# Altium footprint library PBL - THD Packages.PcbLib: 256 footprints (part 16 of 16)
Each footprint in its own frame and in the unit in brackets; x right, y up, seen from the top. Pads: shape width x height; smd on the part's side, far side on the other; paste and mask are expansions set on the pad; w line width, h text height; cw(c..) or ccw(c..) is an arc to the next point about the centre after c.
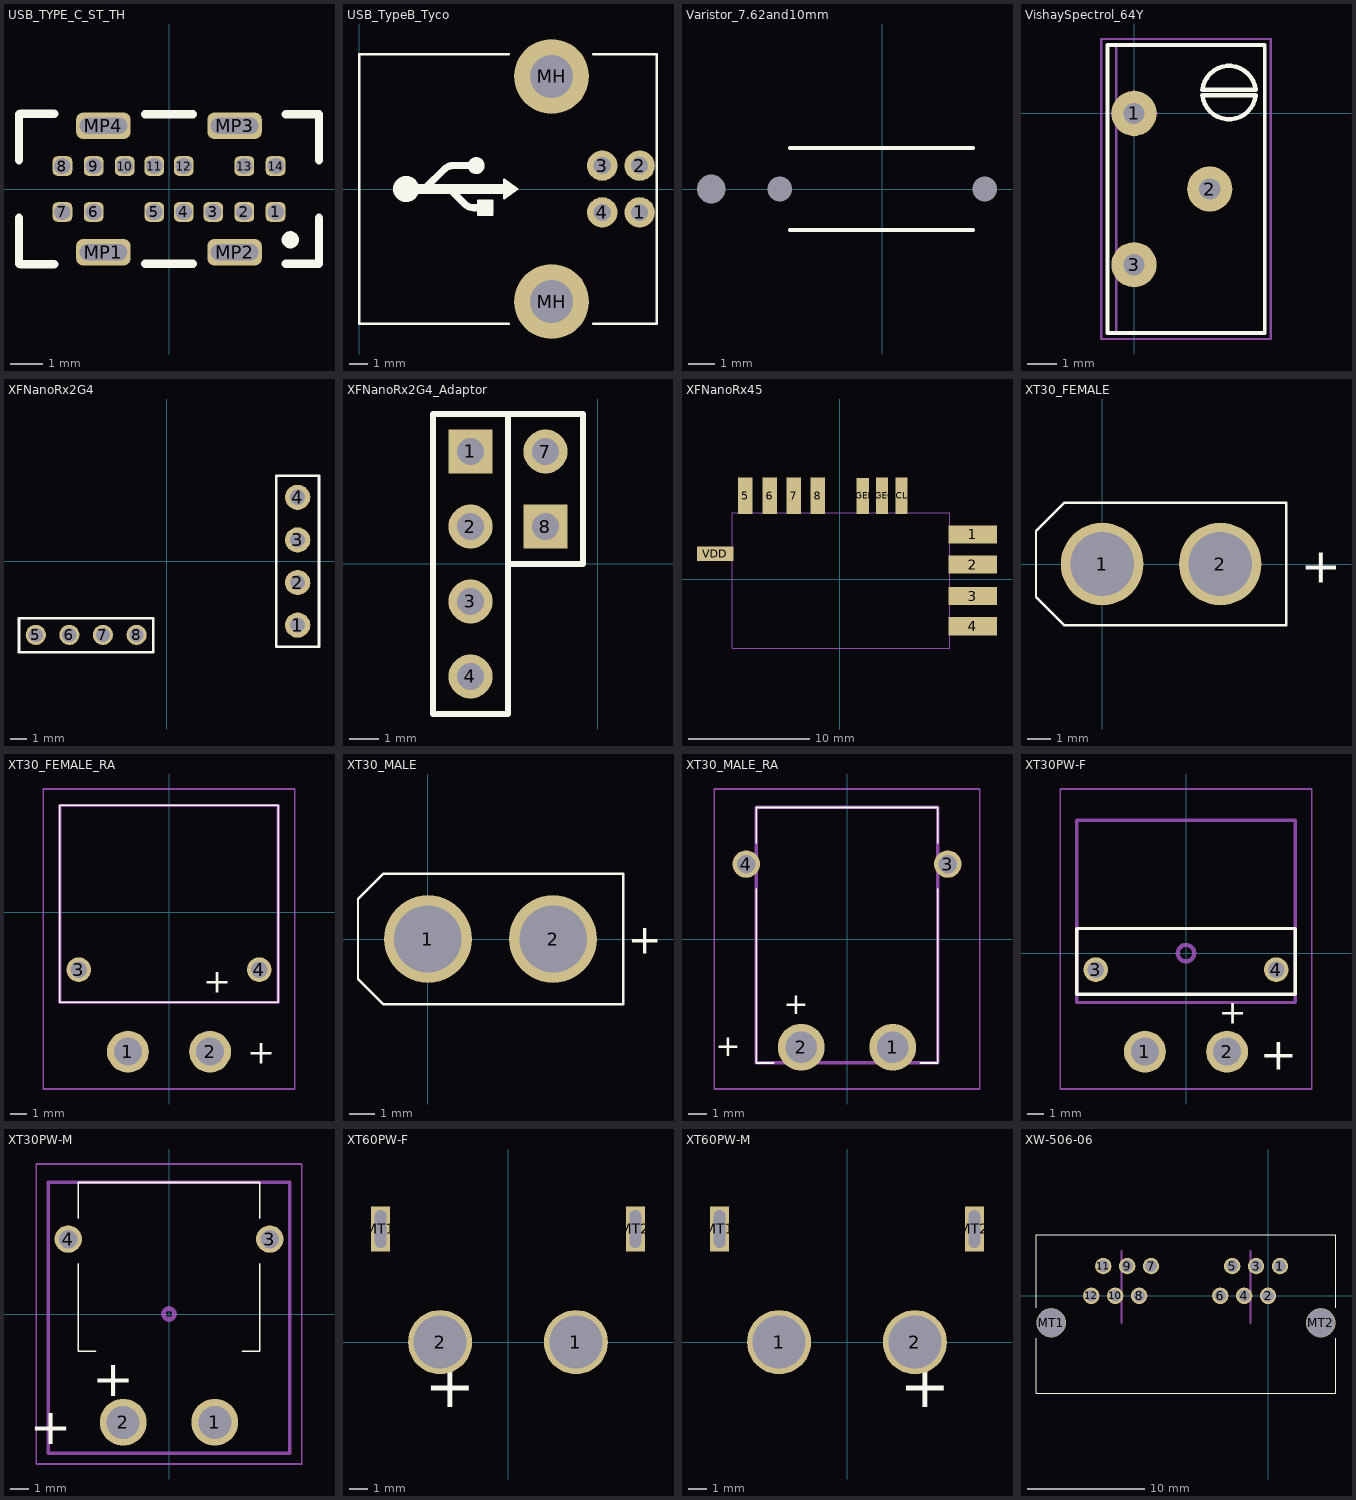
[diagram p15: the footprints below, top view; thin cyan lines are the x and y axes]

## USB_TYPE_C_ST_TH [mm]
pads (18):
  rrect50% 0.6x0.6 hole 0.5: 1(3.25,-0.7) 2(2.3,-0.7) 3(1.35,-0.7) 4(0.45,-0.7) 5(-0.45,-0.7) 6(-2.3,-0.7) 7(-3.25,-0.7) 8(-3.25,0.7) 9(-2.3,0.7) 10(-1.35,0.7) 11(-0.45,0.7) 12(0.45,0.7) 13(2.3,0.7) 14(3.25,0.7)
  rrect50% 1.658x0.8 hole 0.5 slot 1.45 at 0 deg: MP1(-2,-1.93) MP2(2,-1.93) MP3(2,1.93) MP4(-2,1.93)
Top Overlay:
  circle w0.254: c3.7,-1.55 r0.135
  lines w0.254: -4.575,-2.275 -4.575,-0.875 ; -4.575,0.875 -4.575,2.275 ; -4.516,-2.3 -3.5,-2.3 ; -4.516,2.3 -3.5,2.3 ; -0.731,-2.275 0.731,-2.275 ; -0.731,2.275 0.731,2.275 ; 3.559,-2.275 4.575,-2.275 4.575,-0.875 ; 3.559,2.275 4.575,2.275 4.575,0.875
3D body "USB3.1TYPE-C 14P.STP": height 10, standoff -1.2, extent -4.5,-2.5 4.5,2.5

## USB_TypeB_Tyco [mm]
height 11.1
pads (6):
  round 1.626 hole 0.914: 1(14.99,-1.25) 2(14.99,1.25) 3(12.99,1.25) 4(12.99,-1.25)
  round 4 hole 2.3: MH(10.28,-6.02) MH(10.28,6.02)
Top Overlay:
  circle w0.508: c6.25,1.25 r0.2
  circle w0.889: c2.5,0 r0.254
  region: 7.1,-1.375 6.35,-1.375 6.35,-0.625 7.1,-0.625
  region: 8.45,0 7.75,-0.5 7.75,0.5
  lines w0.127: 8,-7.2 0,-7.2 0,7.2 8,7.2 ; 12.5,-7.2 15.9,-7.2 15.9,7.2 12.5,7.2 ; 6.35,-1.375 7.1,-1.375 7.1,-0.625 6.35,-0.625 6.35,-1.375 ; 7.75,-0.5 7.75,0.5 8.45,0 7.75,-0.5
  lines w0.381: 3.547,0.062 4.547,1.062 cw(c5,0.61) 5,1.25 6.25,1.25 ; 4.897,-0.062 5.647,-0.812 ccw(c6.1,-0.36) 6.1,-1 6.35,-1
  lines w0.508: 3,0 7.75,0
3D body "c-0292304-01-b-3d.stp": height 11.5, standoff -3.93, extent 0,-7.194 15.7,7.194

## Varistor_7.62and10mm [mil] "Capacitor, Ceramic, Thru-Hole, Dipped Radial; Body 6.8 x 3 mm (WxT) Pin Spacing 7.62 mm (typ)"
height 236.22
pads (3):
  round 0 / inner round 0 / far side round 100 hole 42 unplated: 1(-250,0)
  round 0 / inner round 0 / far side oval 100x85 hole 36 unplated: 1(-150,0) 2(150,0)
Top Overlay:
  lines w6: -135,-60 132.72,-60 ; -135,60 132.72,60
3D body "MOV-10N331k_V.STEP": height 472.44, standoff -98.43, extent -216.47,-69.98 216.44,68.36

## VishaySpectrol_64Y [mil] "VISHAY SPECTROL - 64Y - TRIMMER"
height 437.01
pads (3):
  round 60 hole 28: 1(0,0) 2(100.39,-100.39) 3(0,-200.79)
Top Overlay:
  lines w5: -35.43,-291.34 173.23,-291.34 173.23,90.55 -35.43,90.55 -35.43,-291.34
  lines w6: 90.69,23.81 161.27,23.81 ; 90.68,31.31 161.28,31.31 ; 90.75,23.82 ccw(c125.98,27.55) 161.21,23.82 ; 90.74,31.3 cw(c125.98,27.55) 161.22,31.3
13 - 3D Top Side:
  lines w3: -23.62,-291.34 173.23,-291.34 173.23,90.55 -23.62,90.55 -23.62,-291.34
15 - Top Courtyards:
  lines w3: -30,0 30,0 ; 0,-30 0,30 ; -43.62,-299.34 -43.62,98.66 181.38,98.66 181.38,-299.34 -43.62,-299.34
3D body: height 437.01, standoff 385.83, extent 82.68,-15.75 168.95,70.7
3D body: height 385.83, standoff 0, extent -23.62,-291.34 173.23,90.55

## XFNanoRx2G4 [mm] "baudrate translater"
pads (8):
  round 1.5 hole 0.9: 1(7.8,-3.8) 2(7.8,-1.26) 3(7.8,1.28) 4(7.8,3.82)
  round 1.2 hole 0.85: 5(-7.8,-4.38) 6(-5.8,-4.38) 7(-3.8,-4.38) 8(-1.8,-4.38)
Top Overlay:
  lines w0.15: 6.53,-5.07 6.53,5.09 ; 6.53,-5.07 6.53,5.09 ; 6.53,-5.07 6.53,-5.07 ; 6.53,-5.07 6.53,-5.07 ; 6.53,-5.07 9.07,-5.07 ; 6.53,-5.07 9.07,-5.07 ; 6.53,5.09 6.53,5.09 ; 6.53,5.09 6.53,5.09 ; 6.53,5.09 9.07,5.09 ; 6.53,5.09 9.07,5.09 ; 9.07,-5.07 9.07,5.09 ; 9.07,-5.07 9.07,5.09 ; 9.07,-5.07 9.07,-5.07 ; 9.07,-5.07 9.07,-5.07 ; 9.07,5.09 9.07,5.09 ; 9.07,5.09 9.07,5.09 ; -8.8,-5.4 -0.8,-5.4 -0.8,-3.4 -8.8,-3.4 -8.8,-5.4
Bottom Overlay:
  lines w0.15: 6.53,-5.07 6.53,-5.07 ; 6.53,-5.07 9.07,-5.07 ; 6.53,-5.07 9.07,-5.07 ; 6.53,-5.07 6.53,5.09 ; 6.53,-5.07 6.53,5.09 ; 6.53,-5.07 6.53,-5.07 ; 6.53,5.09 6.53,5.09 ; 6.53,5.09 9.07,5.09 ; 6.53,5.09 9.07,5.09 ; 6.53,5.09 6.53,5.09 ; 9.07,-5.07 9.07,5.09 ; 9.07,-5.07 9.07,5.09 ; 9.07,-5.07 9.07,-5.07 ; 9.07,-5.07 9.07,-5.07 ; 9.07,5.09 9.07,5.09 ; 9.07,5.09 9.07,5.09 ; -8.8,-5.4 -0.8,-5.4 -0.8,-3.4 -8.8,-3.4 -8.8,-5.4
3D body "XFNanoRx2G4v1.1.step": height 4.45, standoff 0.93, extent -9.115,-5.5 9.1,5.5

## XFNanoRx2G4_Adaptor [mm] "baudrate translater"
pads (6):
  rect 1.5x1.5 hole 0.9: 1(-4.318,3.8) 8(-1.778,1.26)
  round 1.5 hole 0.9: 2(-4.318,1.26) 3(-4.318,-1.28) 4(-4.318,-3.82) 7(-1.778,3.8)
Top Overlay:
  lines w0.2: -3.048,5.07 -5.588,5.07 -5.588,-5.09 -3.048,-5.09 -3.048,5.07 ; -3.048,5.07 -3.048,-0.01 -0.508,-0.01 -0.508,5.07 -3.048,5.07
3D body "Baudrate_Adaptor.step": height 9.45, standoff 3.41, extent -9.398,-5.588 9.017,5.588

## XFNanoRx45 [mm] "baudrate translater"
pads (12):
  rect 4x1.5 smd: 1(11,3.7) 2(11,1.2) 3(11,-1.4) 4(11,-3.9)
  rect 1.2x3 smd: 5(-7.8,6.9) 6(-5.8,6.9) 7(-3.8,6.9) 8(-1.8,6.9)
  rect 1x3 smd paste-0.6: MCLR(5.1,6.9) PGEC(3.5,6.9) PGED(1.9,6.88)
  rect 3x1.2 smd paste-0.6: VDD(-10.3,2.1)
01 - Outline:
  lines w0.1: -8.9,-5.7 -8.9,5.5 9.1,5.5 9.1,-5.7 -8.9,-5.7
3D body "XFNanoRx45.step": height 1, standoff -2.5, extent -8.905,-5.663 9.095,5.477

## XT30_FEMALE [mm]
pads (2):
  round 3.5 hole 2.7: 1(0,0) 2(5,0)
Top Overlay:
  lines w0.1: -2.8,-1.4 -1.6,-2.6 7.8,-2.6 7.8,0.2 7.8,2.6 -1.6,2.6 -2.8,1.4 -2.8,-1.4
  text "+" at 8.4,-0.8 h1.5

## XT30_FEMALE_RA [mm]
pads (4):
  round 2.55 hole 1.7: 1(-2.5,-8.5) 2(2.5,-8.5)
  round 1.5 hole 1: 3(-5.5,-3.5) 4(5.5,-3.5)
Top Overlay:
  lines w0.1: -6.65,-5.5 6.65,-5.5 6.65,6.5 -6.65,6.5 -6.65,-5.5
  text "+" at 2.1,-4.9 h1.5
  text "+" at 4.766,-9.223 h1.5
13 - 3D Top Side:
  lines w0.2: -6.65,-5.5 6.65,-5.5 6.65,6.5 -6.65,6.5 -6.65,-5.5
15 - Top Courtyards:
  lines w0.1: -7.65,-10.775 7.65,-10.775 7.65,7.5 -7.65,7.5 -7.65,-10.775
3D body "XT30PW-F.stp": height 5.1, standoff -5, extent -6.65,-9.249 6.65,6.5

## XT30_MALE [mm]
pads (2):
  round 3.5 hole 2.7: 1(0,0) 2(5,0)
Top Overlay:
  lines w0.1: -2.8,-1.6 -2.8,1.6 -1.8,2.6 7.8,2.6 7.8,-0.2 7.8,-2.6 -1.8,-2.6 -2.8,-1.6
  text "+" at 8,-0.6 h1.2

## XT30_MALE_RA [mm]
pads (4):
  round 2.55 hole 1.7: 1(2.5,-5.912) 2(-2.5,-5.912)
  round 1.5 hole 1: 3(5.5,4.088) 4(-5.5,4.088)
Top Overlay:
  lines w0.1: -4.95,2.737 -4.95,-6.762 -4,-6.762 ; -4.95,5.237 -4.95,7.187 4.95,7.187 4.95,5.237 ; 4,-6.762 4.95,-6.762 4.95,2.737
  text "+" at -2.1,-4.1 h1.2
  text "+" at -5.8,-6.4 h1.2
13 - 3D Top Side:
  lines w0.2: -4.95,-6.762 4.95,-6.762 4.95,7.187 -4.95,7.187 -4.95,-6.762
15 - Top Courtyards:
  lines w0.1: -7.25,-8.188 7.25,-8.188 7.25,8.188 -7.25,8.188 -7.25,-8.188
3D body "XT30PW-M.stp": height 5.1, standoff -5, extent -5.897,-6.762 5.9,7.187

## XT30PW-F [mm] "XT30 RA female header"
pads (4):
  round 2.55 hole 1.7: 1(-2.5,-6) 2(2.5,-6)
  round 1.5 hole 1: 3(-5.5,-1) 4(5.5,-1)
Top Overlay:
  lines w0.2: -6.65,-2.5 6.65,-2.5 6.65,1.5 -6.65,1.5 -6.65,-2.5
  text "+" at 2,-4.3 h1.5
  text "+" at 4.5,-7.1 h2
Top Component Center:
  circle w0.254: c0,0 r0.5
13 - 3D Top Side:
  lines w0.2: -6.65,-3 6.65,-3 6.65,8.1 -6.65,8.1 -6.65,-3
15 - Top Courtyards:
  lines w0.1: -7.65,-8.275 7.65,-8.275 7.65,10 -7.65,10 -7.65,-8.275
3D body "XT30PW-F.STEP": height 5, standoff -2, extent -6.65,-7.05 6.65,7.85

## XT30PW-M [mm] "XT30 RA male header"
pads (4):
  round 2.55 hole 1.8: 1(2.5,-5.912) 2(-2.5,-5.912)
  round 1.5 hole 1: 3(5.5,4.088) 4(-5.5,4.088)
Top Overlay:
  lines w0.1: -4.95,2.737 -4.95,-2.032 -4,-2.032 ; -4.95,5.237 -4.95,7.187 4.95,7.187 4.95,5.237 ; 4,-2.032 4.95,-2.032 4.95,2.737
  text "+" at -5.3,-7.1 h2
  text "+" at -1.9,-4.5 h2
Top Component Center:
  circle w0.254: c0,0 r0.3
13 - 3D Top Side:
  lines w0.2: -6.6,-7.6 -6.6,7.187 6.6,7.187 6.6,-7.6 -6.6,-7.6
15 - Top Courtyards:
  lines w0.1: -7.25,-8.188 -7.25,8.188 7.25,8.188 7.25,-8.188 -7.25,-8.188
3D body "Amass_XT30PW-M_pcb solder.stp": height 5.3, standoff -3.15, extent -6.65,-6.85 6.65,7.1

## XT60PW-F [mm] "XT60 RA Female PCB header"
pads (4):
  round 3.4 hole 2.8 mask+0.05: 1(3.6,0) 2(-3.6,0)
  rect 1x2.4 hole 0.6 slot 2 at 90 deg mask+0.05: MT1(-6.75,6) MT2(6.75,6)
Top Overlay:
  text "+" at -4.4,-4.215 h4
3D body "XT60PW-F20_Connector.stp": height 8.5, standoff -2.9, extent -8,-1.75 8,15.25

## XT60PW-M [mm] "XT60 RA Male PCB header"
pads (4):
  round 3.4 hole 2.8 mask+0.05: 1(-3.6,0) 2(3.6,0)
  rect 1x2.4 hole 0.6 slot 2 at 90 deg mask+0.05: MT1(-6.75,6) MT2(6.75,6)
Top Overlay:
  text "+" at 2.8,-4.215 h4
3D body "XT60PW-M20_Connector.stp": height 8.5, standoff -2.9, extent -8,-1.8 8,16.6

## XW-506-06 [mm] "RJ11 dual port"
pads (14):
  round 1.4 hole 1: 1(1.02,2.54) 2(0,0) 3(-1.02,2.54) 4(-2.04,0) 5(-3.06,2.54) 6(-4.08,0) 7(-9.98,2.54) 8(-11,0) 9(-12.02,2.54) 10(-13.04,0) 11(-14.06,2.54) 12(-15.08,0)
  round 2.5 hole 2.4: MT1(-18.5,-2.3) MT2(4.5,-2.3)
Top Overlay:
  lines w0.1: -19.8,-3.6 -19.8,-8.3 5.8,-8.3 5.8,-3.6 ; -19.8,-1 -19.8,5.2 5.8,5.2 5.8,-1
Mechanical 3:
  lines w0.2: -12.5,-2.3 -12.5,3.8 ; -1.5,-2.3 -1.5,3.8
3D body "XW-506-06 5521 6P6C-1X2-E.stp": height 14.67, standoff -3.08, extent -19.85,-8.3 5.65,4.7